# Altium footprint library разъёмы.PcbLib: 129 footprints (part 9 of 9)
Each footprint in its own frame and in the unit in brackets; x right, y up, seen from the top. Pads: shape width x height; smd on the part's side, far side on the other; paste and mask are expansions set on the pad; w line width, h text height; cw(c..) or ccw(c..) is an arc to the next point about the centre after c.
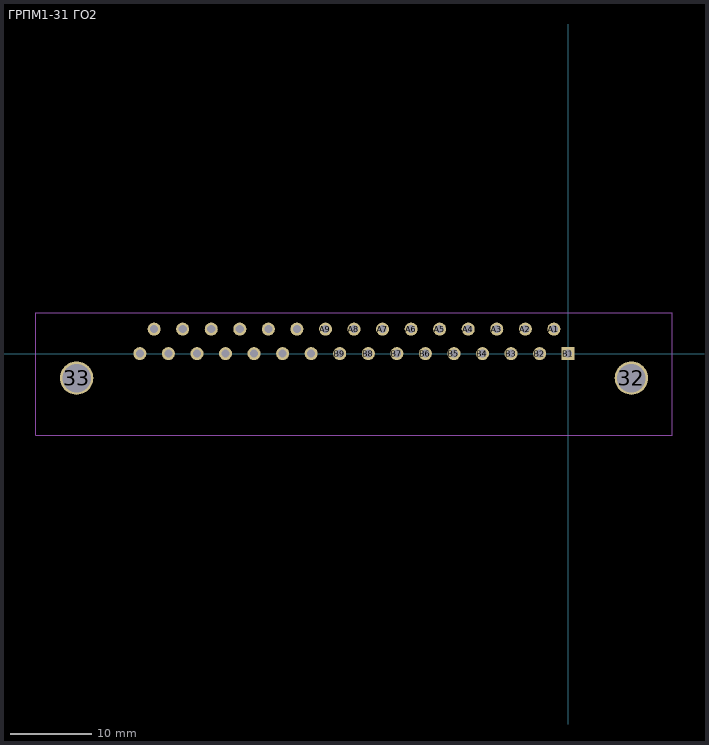
[diagram p8: the footprint, top view; thin cyan lines are the x and y axes]

## ГРПМ1-31 ГО2 [mm]
pads (33):
  round 4.1 hole 3.5: 32(7.75,-3) 33(-60.25,-3)
  round 1.6 hole 1: A1(-1.75,3) A2(-5.25,3) A3(-8.75,3) A4(-12.25,3) A5(-15.75,3) A6(-19.25,3) A7(-22.75,3) A8(-26.25,3) A9(-29.75,3) A10(-33.25,3) A11(-36.75,3) A12(-40.25,3) A13(-43.75,3) A14(-47.25,3) A15(-50.75,3) B2(-3.5,0) B3(-7,0) B4(-10.5,0) B5(-14,0) B6(-17.5,0) B7(-21,0) B8(-24.5,0) B9(-28,0) B10(-31.5,0) B11(-35,0) B12(-38.5,0) B13(-42,0) B14(-45.5,0) B15(-49,0) B16(-52.5,0)
  rect 1.6x1.6 hole 1: B1(0,0)
Mechanical 1:
  lines w0.1: -65.25,-10 -65.25,5 12.75,5 12.75,-10 -65.25,-10